# Altium footprint library 6-Connectors-3.PcbLib: 153 footprints (part 9 of 11)
Each footprint in its own frame and in the unit in brackets; x right, y up, seen from the top. Pads: shape width x height; smd on the part's side, far side on the other; paste and mask are expansions set on the pad; w line width, h text height; cw(c..) or ccw(c..) is an arc to the next point about the centre after c.
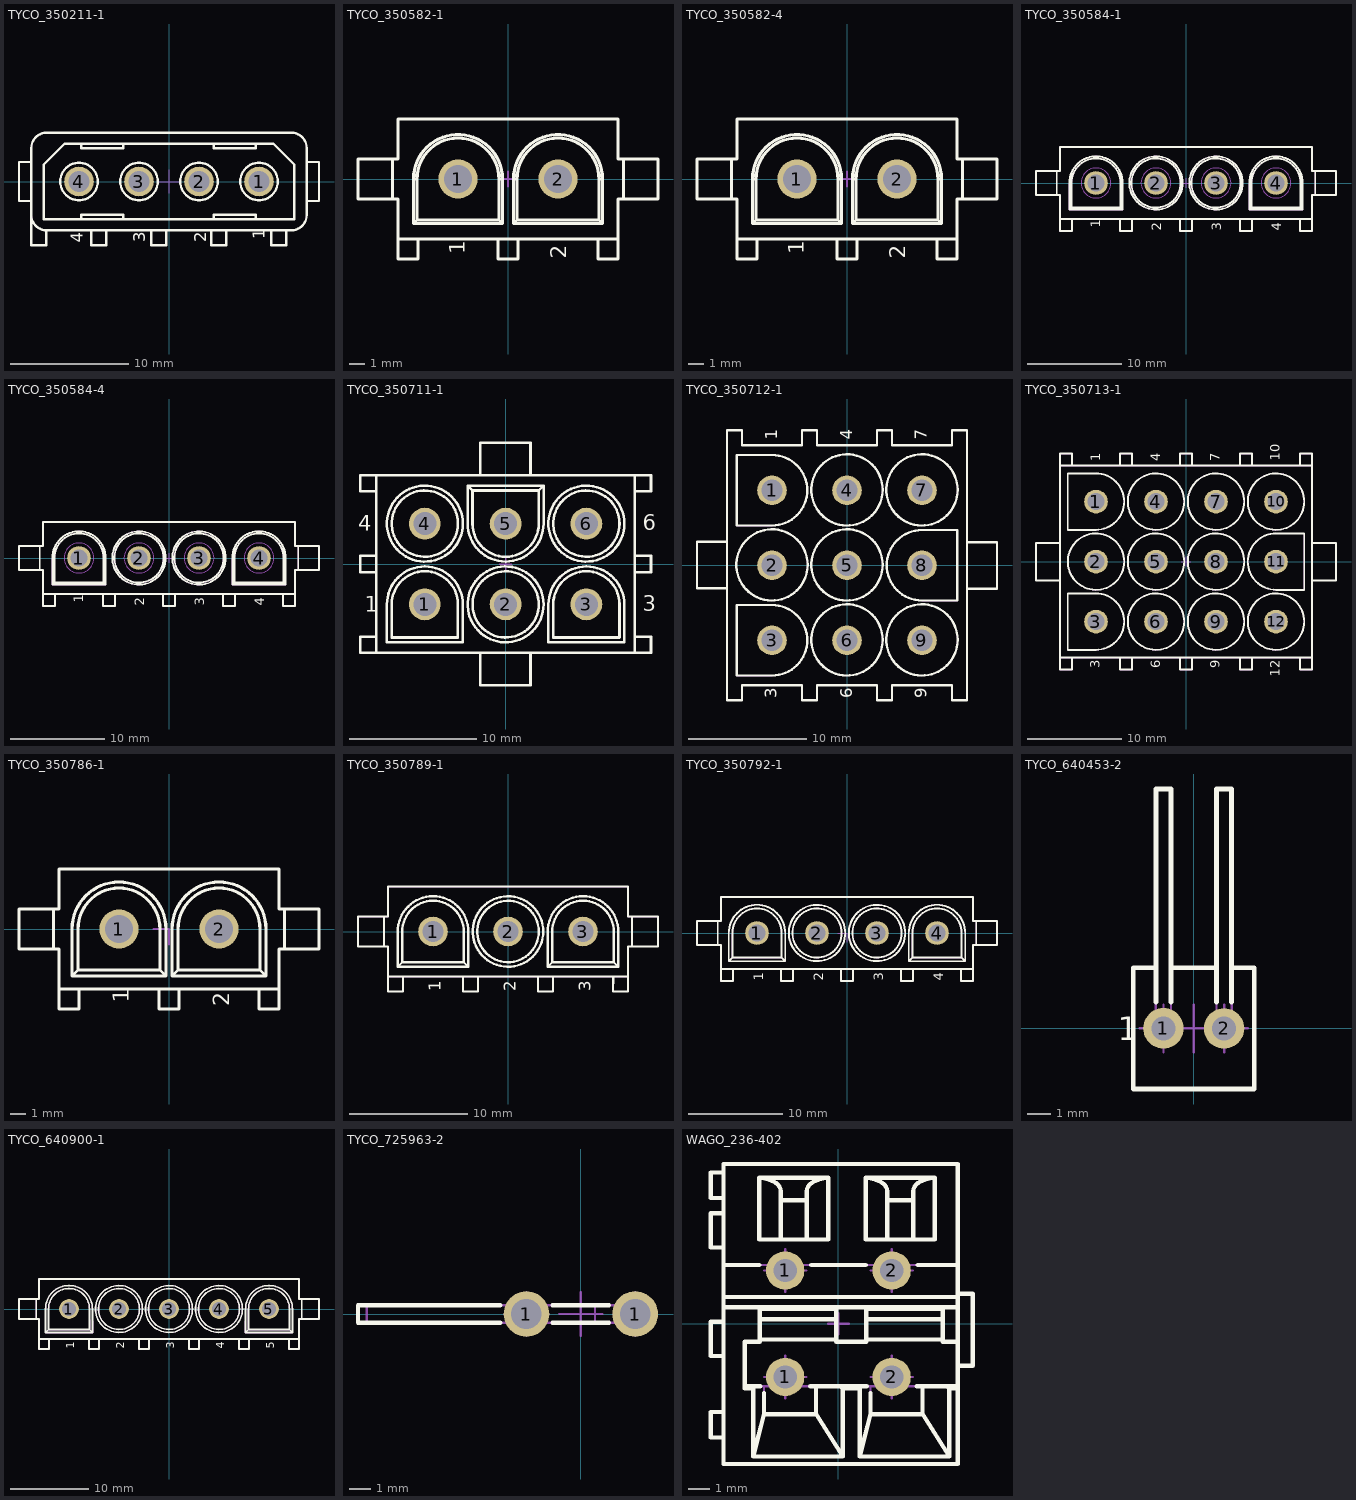
[diagram p8: the footprints below, top view; thin cyan lines are the x and y axes]

## TYCO_350211-1 [mm] "4 Circuits In-Line - 200\" Centerline, Commercial MATE-N-LOK Header"
height 10.29
pads (4):
  round 2.5 hole 1.8: 1(7.62,0) 2(2.54,0) 3(-2.54,0) 4(-7.62,0)
Top Overlay:
  circle w0.2: c-7.62,0 r1.587
  circle w0.2: c-2.54,0 r1.587
  circle w0.2: c2.54,0 r1.587
  circle w0.2: c7.62,0 r1.587
  lines w0.2: -11.652,-2.858 ccw(c-10.382,-2.858) -10.382,-4.128 ; -11.652,-1.651 -12.7,-1.651 -12.7,1.651 -11.652,1.651 ; -7.43,-3.207 -7.43,-2.826 -3.874,-2.826 -3.874,-3.207 ; -7.43,3.207 -7.43,2.826 -3.874,2.826 -3.874,3.207 ; -6.572,-4.128 -6.572,-5.398 -5.302,-5.398 -5.302,-4.128 ; -1.492,-4.128 -1.492,-5.398 -0.222,-5.398 -0.222,-4.128 ; 3.588,-4.128 3.588,-5.398 4.858,-5.398 4.858,-4.128 ; 3.797,-3.207 3.797,-2.826 7.353,-2.826 7.353,-3.207 ; 3.797,3.207 3.797,2.826 7.353,2.826 7.353,3.207 ; 7.537,-3.175 7.734,-3.175 ; 8.668,-4.128 8.668,-5.398 9.938,-5.398 9.938,-4.128 ; 11.652,-1.651 12.7,-1.651 12.7,1.651 11.652,1.651 ; -10.382,-4.128 -10.382,-5.398 -11.652,-5.398 -11.652,2.858 cw(c-10.382,2.858) -10.382,4.128 10.382,4.128 cw(c10.382,2.858) 11.652,2.858 11.652,-2.858 cw(c10.382,-2.858) 10.382,-4.128 -10.382,-4.128 ; -10.605,-3.207 -10.605,1.429 -8.827,3.207 8.827,3.207 10.605,1.429 10.605,-3.207 -10.605,-3.207
  text "1" at 8.1,-4.9 h1.02
  text "2" at 3.175,-5.15 h1.02
  text "3" at -2.015,-5.155 h1.02
  text "4" at -7.315,-5.205 h1.02
Mechanical 8:
  lines w0.1: -8.62,0 -7.62,0 ; -7.62,-1 -7.62,0 ; -7.62,1 -7.62,0 ; -6.62,0 -7.62,0 ; -3.54,0 -2.54,0 ; -2.54,-1 -2.54,0 ; -2.54,1 -2.54,0 ; -1.54,0 -2.54,0 ; -1,0 0,0 ; 0,-1 0,0 ; 0,1 0,0 ; 1,0 0,0 ; 1.54,0 2.54,0 ; 2.54,-1 2.54,0 ; 2.54,1 2.54,0 ; 3.54,0 2.54,0 ; 6.62,0 7.62,0 ; 7.62,-1 7.62,0 ; 7.62,1 7.62,0 ; 8.62,0 7.62,0
Mechanical 14:
  circle w0.1: c-7.62,0 r1.048
  circle w0.1: c-7.62,0 r1.587
  circle w0.1: c-2.54,0 r1.048
  circle w0.1: c-2.54,0 r1.587
  circle w0.1: c2.54,0 r1.048
  circle w0.1: c2.54,0 r1.587
  circle w0.1: c7.62,0 r1.048
  circle w0.1: c7.62,0 r1.587
  lines w0.1: -11.652,-2.858 ccw(c-10.382,-2.858) -10.382,-4.128 ; -11.652,-1.651 -12.7,-1.651 -12.7,1.651 -11.652,1.651 ; -7.43,-3.207 -7.43,-2.826 -3.874,-2.826 -3.874,-3.207 ; -7.43,3.207 -7.43,2.826 -3.874,2.826 -3.874,3.207 ; -6.572,-4.128 -6.572,-5.398 -5.302,-5.398 -5.302,-4.128 ; -1.492,-4.128 -1.492,-5.398 -0.222,-5.398 -0.222,-4.128 ; 3.588,-4.128 3.588,-5.398 4.858,-5.398 4.858,-4.128 ; 3.797,-3.207 3.797,-2.826 7.353,-2.826 7.353,-3.207 ; 3.797,3.207 3.797,2.826 7.353,2.826 7.353,3.207 ; 7.537,-3.175 7.734,-3.175 ; 8.668,-4.128 8.668,-5.398 9.938,-5.398 9.938,-4.128 ; 11.652,-1.651 12.7,-1.651 12.7,1.651 11.652,1.651 ; -10.382,-4.128 -10.382,-5.398 -11.652,-5.398 -11.652,2.858 cw(c-10.382,2.858) -10.382,4.128 10.382,4.128 cw(c10.382,2.858) 11.652,2.858 11.652,-2.858 cw(c10.382,-2.858) 10.382,-4.128 -10.382,-4.128 ; -10.605,-3.207 -10.605,1.429 -8.827,3.207 8.827,3.207 10.605,1.429 10.605,-3.207 -10.605,-3.207
  text "1" at 8.1,-4.9 h1.02
  text "2" at 3.175,-5.15 h1.02
  text "3" at -2.015,-5.155 h1.02
  text "4" at -7.315,-5.205 h1.02
3D body "TYCO_350211-1.stp": height 10.29, standoff -3.43, extent -12.7,-5.397 12.7,4.128

## TYCO_350582-1 [mm] "2 Circuits In-Line - Universal MATE-N-LOK Connector"
height 14.73
pads (2):
  round 2.5 hole 1.8: 1(-3.175,0) 2(3.175,0)
Top Overlay:
  lines w0.2: -7.325,-1.27 -7.325,1.27 ; -6.985,-3.81 6.985,-3.81 ; -5.715,-3.81 -5.715,-5.08 -6.985,-5.08 -6.985,-1.27 -9.525,-1.27 -9.525,1.27 -6.985,1.27 -6.985,3.81 6.985,3.81 6.985,1.27 9.525,1.27 9.525,-1.27 6.985,-1.27 6.985,-5.08 5.715,-5.08 5.715,-3.81 ; -0.635,-3.81 -0.635,-5.08 0.635,-5.08 0.635,-3.81 ; 7.325,-1.27 7.325,1.27 ; -5.998,-2.823 -0.352,-2.823 ; -5.998,-2.823 -5.779,-2.604 ; -5.998,-2.823 -5.998,0 ; -5.998,0 cw(c-3.175,0) -0.352,0 ; -5.998,0 -5.779,0 ; -5.779,-2.604 -0.572,-2.604 ; -5.779,-2.604 -5.779,0 ; -5.779,0 cw(c-3.175,0) -0.572,0 ; -0.572,-2.604 -0.572,0 ; -0.572,-2.604 -0.352,-2.823 ; -0.572,0 -0.352,0 ; -0.352,-2.823 -0.352,0 ; 0.352,-2.823 0.572,-2.604 ; 0.352,-2.823 0.352,0 ; 0.352,-2.823 5.998,-2.823 ; 0.352,0 cw(c3.175,0) 5.998,0 ; 0.352,0 0.572,0 ; 0.572,-2.604 0.572,0 ; 0.572,-2.604 5.779,-2.604 ; 0.572,0 cw(c3.175,0) 5.779,0 ; 5.779,-2.604 5.779,0 ; 5.779,-2.604 5.998,-2.823 ; 5.779,0 5.998,0 ; 5.998,-2.823 5.998,0
  text "2" at 3.712,-5.06 h1
  text "1" at -2.746,-4.783 h1
Mechanical 8:
  lines w0.1: -3.675,0 -3.175,0 ; -3.175,-0.5 -3.175,0 ; -3.175,0.5 -3.175,0 ; -2.675,0 -3.175,0 ; -0.5,0 0,0 ; 0,-0.5 0,0 ; 0,0.5 0,0 ; 0.5,0 0,0 ; 2.675,0 3.175,0 ; 3.175,-0.5 3.175,0 ; 3.175,0.5 3.175,0 ; 3.675,0 3.175,0
Mechanical 14:
  circle w0.1: c-3.175,0 r0.965
  circle w0.1: c3.175,0 r0.965
  lines w0.1: -7.325,-1.27 -7.325,1.27 ; -6.985,-3.81 6.985,-3.81 ; -5.715,-3.81 -5.715,-5.08 -6.985,-5.08 -6.985,-1.27 -9.525,-1.27 -9.525,1.27 -6.985,1.27 -6.985,3.81 6.985,3.81 6.985,1.27 9.525,1.27 9.525,-1.27 6.985,-1.27 6.985,-5.08 5.715,-5.08 5.715,-3.81 ; -4.12,-0.222 -2.23,-0.222 ; -4.12,0.222 -2.23,0.222 ; -0.635,-3.81 -0.635,-5.08 0.635,-5.08 0.635,-3.81 ; 2.23,-0.222 4.12,-0.222 ; 2.23,0.222 4.12,0.222 ; 7.325,-1.27 7.325,1.27 ; -5.998,-2.823 -0.352,-2.823 ; -5.998,-2.823 -5.779,-2.604 ; -5.998,-2.823 -5.998,0 ; -5.998,0 cw(c-3.175,0) -0.352,0 ; -5.998,0 -5.779,0 ; -5.779,-2.604 -0.572,-2.604 ; -5.779,-2.604 -5.779,0 ; -5.779,0 cw(c-3.175,0) -0.572,0 ; -0.572,-2.604 -0.572,0 ; -0.572,-2.604 -0.352,-2.823 ; -0.572,0 -0.352,0 ; -0.352,-2.823 -0.352,0 ; 0.352,-2.823 0.572,-2.604 ; 0.352,-2.823 0.352,0 ; 0.352,-2.823 5.998,-2.823 ; 0.352,0 cw(c3.175,0) 5.998,0 ; 0.352,0 0.572,0 ; 0.572,-2.604 0.572,0 ; 0.572,-2.604 5.779,-2.604 ; 0.572,0 cw(c3.175,0) 5.779,0 ; 5.779,-2.604 5.779,0 ; 5.779,-2.604 5.998,-2.823 ; 5.779,0 5.998,0 ; 5.998,-2.823 5.998,0
  text "2" at 3.712,-5.06 h1
  text "1" at -2.746,-4.783 h1
3D body "TYCO_350582-1.stp": height 14.82, standoff -5.33, extent -9.525,-5.08 9.525,3.81

## TYCO_350582-4 [mm] "2 Circuits In-Line - Universal MATE-N-LOK Connector"
height 14.73
pads (2):
  round 2.5 hole 1.8: 1(-3.175,0) 2(3.175,0)
Top Overlay:
  lines w0.2: -7.325,-1.27 -7.325,1.27 ; -6.985,-3.81 6.985,-3.81 ; -5.715,-3.81 -5.715,-5.08 -6.985,-5.08 -6.985,-1.27 -9.525,-1.27 -9.525,1.27 -6.985,1.27 -6.985,3.81 6.985,3.81 6.985,1.27 9.525,1.27 9.525,-1.27 6.985,-1.27 6.985,-5.08 5.715,-5.08 5.715,-3.81 ; -0.635,-3.81 -0.635,-5.08 0.635,-5.08 0.635,-3.81 ; 7.325,-1.27 7.325,1.27 ; -5.998,-2.823 -0.352,-2.823 ; -5.998,-2.823 -5.779,-2.604 ; -5.998,-2.823 -5.998,0 ; -5.998,0 cw(c-3.175,0) -0.352,0 ; -5.998,0 -5.779,0 ; -5.779,-2.604 -0.572,-2.604 ; -5.779,-2.604 -5.779,0 ; -5.779,0 cw(c-3.175,0) -0.572,0 ; -0.572,-2.604 -0.572,0 ; -0.572,-2.604 -0.352,-2.823 ; -0.572,0 -0.352,0 ; -0.352,-2.823 -0.352,0 ; 0.352,-2.823 0.572,-2.604 ; 0.352,-2.823 0.352,0 ; 0.352,-2.823 5.998,-2.823 ; 0.352,0 cw(c3.175,0) 5.998,0 ; 0.352,0 0.572,0 ; 0.572,-2.604 0.572,0 ; 0.572,-2.604 5.779,-2.604 ; 0.572,0 cw(c3.175,0) 5.779,0 ; 5.779,-2.604 5.779,0 ; 5.779,-2.604 5.998,-2.823 ; 5.779,0 5.998,0 ; 5.998,-2.823 5.998,0
  text "2" at 3.712,-5.06 h1
  text "1" at -2.746,-4.783 h1
Mechanical 8:
  lines w0.1: -3.675,0 -3.175,0 ; -3.175,-0.5 -3.175,0 ; -3.175,0.5 -3.175,0 ; -2.675,0 -3.175,0 ; -0.5,0 0,0 ; 0,-0.5 0,0 ; 0,0.5 0,0 ; 0.5,0 0,0 ; 2.675,0 3.175,0 ; 3.175,-0.5 3.175,0 ; 3.175,0.5 3.175,0 ; 3.675,0 3.175,0
Mechanical 14:
  circle w0.1: c-3.175,0 r0.965
  circle w0.1: c3.175,0 r0.965
  lines w0.1: -7.325,-1.27 -7.325,1.27 ; -6.985,-3.81 6.985,-3.81 ; -5.715,-3.81 -5.715,-5.08 -6.985,-5.08 -6.985,-1.27 -9.525,-1.27 -9.525,1.27 -6.985,1.27 -6.985,3.81 6.985,3.81 6.985,1.27 9.525,1.27 9.525,-1.27 6.985,-1.27 6.985,-5.08 5.715,-5.08 5.715,-3.81 ; -4.12,-0.222 -2.23,-0.222 ; -4.12,0.222 -2.23,0.222 ; -0.635,-3.81 -0.635,-5.08 0.635,-5.08 0.635,-3.81 ; 2.23,-0.222 4.12,-0.222 ; 2.23,0.222 4.12,0.222 ; 7.325,-1.27 7.325,1.27 ; -5.998,-2.823 -0.352,-2.823 ; -5.998,-2.823 -5.779,-2.604 ; -5.998,-2.823 -5.998,0 ; -5.998,0 cw(c-3.175,0) -0.352,0 ; -5.998,0 -5.779,0 ; -5.779,-2.604 -0.572,-2.604 ; -5.779,-2.604 -5.779,0 ; -5.779,0 cw(c-3.175,0) -0.572,0 ; -0.572,-2.604 -0.572,0 ; -0.572,-2.604 -0.352,-2.823 ; -0.572,0 -0.352,0 ; -0.352,-2.823 -0.352,0 ; 0.352,-2.823 0.572,-2.604 ; 0.352,-2.823 0.352,0 ; 0.352,-2.823 5.998,-2.823 ; 0.352,0 cw(c3.175,0) 5.998,0 ; 0.352,0 0.572,0 ; 0.572,-2.604 0.572,0 ; 0.572,-2.604 5.779,-2.604 ; 0.572,0 cw(c3.175,0) 5.779,0 ; 5.779,-2.604 5.779,0 ; 5.779,-2.604 5.998,-2.823 ; 5.779,0 5.998,0 ; 5.998,-2.823 5.998,0
  text "2" at 3.712,-5.06 h1
  text "1" at -2.746,-4.783 h1
3D body "TYCO_350582-4.stp": height 14.82, standoff -5.33, extent -9.525,-5.08 9.525,3.81

## TYCO_350584-1 [mm] "4 Circuits In-Line - Universal MATE-N-LOK Connector"
height 14.73
pads (4):
  round 2.5 hole 1.8: 1(-9.525,0) 2(-3.175,0) 3(3.175,0) 4(9.525,0)
Top Overlay:
  circle w0.2: c3.175,0 r2.823
  circle w0.2: c-3.175,0 r2.823
  circle w0.2: c3.175,0 r2.604
  circle w0.2: c-3.175,0 r2.604
  lines w0.2: -13.675,-1.27 -13.675,1.27 ; -13.335,-3.81 13.335,-3.81 ; -12.065,-3.81 -12.065,-5.08 -13.335,-5.08 -13.335,-1.27 -15.875,-1.27 -15.875,1.27 -13.335,1.27 -13.335,3.81 13.335,3.81 13.335,1.27 15.875,1.27 15.875,-1.27 13.335,-1.27 13.335,-5.08 12.065,-5.08 12.065,-3.81 ; -6.985,-3.81 -6.985,-5.08 -5.715,-5.08 -5.715,-3.81 ; -0.635,-3.81 -0.635,-5.08 0.635,-5.08 0.635,-3.81 ; 5.715,-3.81 5.715,-5.08 6.985,-5.08 6.985,-3.81 ; 13.675,-1.27 13.675,1.27 ; -12.348,-2.823 -6.702,-2.823 ; -12.348,-2.823 -12.129,-2.604 ; -12.348,-2.823 -12.348,0 ; -12.348,0 cw(c-9.525,0) -6.702,0 ; -12.348,0 -12.129,0 ; -12.129,-2.604 -6.922,-2.604 ; -12.129,-2.604 -12.129,0 ; -12.129,0 cw(c-9.525,0) -6.922,0 ; -6.922,-2.604 -6.702,-2.823 ; -6.922,-2.604 -6.922,0 ; -6.922,0 -6.702,0 ; -6.702,-2.823 -6.702,0 ; 6.702,-2.823 6.922,-2.604 ; 6.702,-2.823 6.702,0 ; 6.702,-2.823 12.348,-2.823 ; 6.702,0 cw(c9.525,0) 12.348,0 ; 6.702,0 6.922,0 ; 6.922,-2.604 6.922,0 ; 6.922,-2.604 12.129,-2.604 ; 6.922,0 cw(c9.525,0) 12.129,0 ; 12.129,-2.604 12.129,0 ; 12.129,-2.604 12.348,-2.823 ; 12.129,0 12.348,0 ; 12.348,-2.823 12.348,0
  text "4" at 10.062,-5.035 h1
  text "3" at 3.712,-5.035 h1
  text "2" at -2.638,-5.035 h1
  text "1" at -9.096,-4.733 h1
Mechanical 8:
  lines w0.1: -10.025,0 -9.525,0 ; -9.525,-0.5 -9.525,0 ; -9.525,0.5 -9.525,0 ; -9.025,0 -9.525,0 ; -3.675,0 -3.175,0 ; -3.175,-0.5 -3.175,0 ; -3.175,0.5 -3.175,0 ; -2.675,0 -3.175,0 ; -0.5,0 0,0 ; 0,-0.5 0,0 ; 0,0.5 0,0 ; 0.5,0 0,0 ; 2.675,0 3.175,0 ; 3.175,-0.5 3.175,0 ; 3.175,0.5 3.175,0 ; 3.675,0 3.175,0 ; 9.025,0 9.525,0 ; 9.525,-0.5 9.525,0 ; 9.525,0.5 9.525,0 ; 10.025,0 9.525,0
Mechanical 14:
  circle w0.1: c-3.175,0 r0.965
  circle w0.1: c3.175,0 r0.965
  circle w0.1: c3.175,0 r2.823
  circle w0.1: c-3.175,0 r2.823
  circle w0.1: c3.175,0 r2.604
  circle w0.1: c-3.175,0 r2.604
  circle w0.1: c-9.525,0 r1.587
  circle w0.1: c9.525,0 r1.587
  circle w0.1: c3.175,0 r1.587
  circle w0.1: c-3.175,0 r1.587
  circle w0.1: c-9.525,0 r1.099
  circle w0.1: c-3.175,0 r1.099
  circle w0.1: c3.175,0 r1.099
  circle w0.1: c9.525,0 r1.099
  lines w0.1: -13.675,-1.27 -13.675,1.27 ; -13.335,-3.81 13.335,-3.81 ; -12.065,-3.81 -12.065,-5.08 -13.335,-5.08 -13.335,-1.27 -15.875,-1.27 -15.875,1.27 -13.335,1.27 -13.335,3.81 13.335,3.81 13.335,1.27 15.875,1.27 15.875,-1.27 13.335,-1.27 13.335,-5.08 12.065,-5.08 12.065,-3.81 ; -10.601,-0.222 -8.449,-0.222 ; -10.601,0.222 -8.449,0.222 ; -10.065,-0.222 ccw(c-9.525,0) -8.985,-0.222 ; -10.065,0.222 cw(c-9.525,0) -8.985,0.222 ; -6.985,-3.81 -6.985,-5.08 -5.715,-5.08 -5.715,-3.81 ; -4.251,-0.222 -2.099,-0.222 ; -4.251,0.222 -2.099,0.222 ; -3.715,-0.222 ccw(c-3.175,0) -2.635,-0.222 ; -3.715,0.222 cw(c-3.175,0) -2.635,0.222 ; -0.635,-3.81 -0.635,-5.08 0.635,-5.08 0.635,-3.81 ; 2.099,-0.222 4.251,-0.222 ; 2.099,0.222 4.251,0.222 ; 2.635,-0.222 ccw(c3.175,0) 3.715,-0.222 ; 2.635,0.222 cw(c3.175,0) 3.715,0.222 ; 5.715,-3.81 5.715,-5.08 6.985,-5.08 6.985,-3.81 ; 8.449,-0.222 10.601,-0.222 ; 8.449,0.222 10.601,0.222 ; 8.985,-0.222 ccw(c9.525,0) 10.065,-0.222 ; 8.985,0.222 cw(c9.525,0) 10.065,0.222 ; 13.675,-1.27 13.675,1.27 ; -12.348,-2.823 -6.702,-2.823 ; -12.348,-2.823 -12.129,-2.604 ; -12.348,-2.823 -12.348,0 ; -12.348,0 cw(c-9.525,0) -6.702,0 ; -12.348,0 -12.129,0 ; -12.129,-2.604 -6.922,-2.604 ; -12.129,-2.604 -12.129,0 ; -12.129,0 cw(c-9.525,0) -6.922,0 ; -6.922,-2.604 -6.702,-2.823 ; -6.922,-2.604 -6.922,0 ; -6.922,0 -6.702,0 ; -6.702,-2.823 -6.702,0 ; 6.702,-2.823 6.922,-2.604 ; 6.702,-2.823 6.702,0 ; 6.702,-2.823 12.348,-2.823 ; 6.702,0 cw(c9.525,0) 12.348,0 ; 6.702,0 6.922,0 ; 6.922,-2.604 6.922,0 ; 6.922,-2.604 12.129,-2.604 ; 6.922,0 cw(c9.525,0) 12.129,0 ; 12.129,-2.604 12.129,0 ; 12.129,-2.604 12.348,-2.823 ; 12.129,0 12.348,0 ; 12.348,-2.823 12.348,0
  text "4" at 10.062,-5.035 h1
  text "3" at 3.712,-5.035 h1
  text "2" at -2.638,-5.035 h1
  text "1" at -9.096,-4.733 h1
3D body "TYCO_350584-1.stp": height 14.82, standoff -5.08, extent -15.875,-5.08 15.875,3.81

## TYCO_350584-4 [mm] "4 Circuits In-Line - Universal MATE-N-LOK Connector"
height 14.73
pads (4):
  round 2.5 hole 1.8: 1(-9.525,0) 2(-3.175,0) 3(3.175,0) 4(9.525,0)
Top Overlay:
  circle w0.2: c-3.175,0 r2.604
  circle w0.2: c3.175,0 r2.604
  circle w0.2: c-3.175,0 r2.823
  circle w0.2: c3.175,0 r2.823
  lines w0.2: -13.675,-1.27 -13.675,1.27 ; -13.335,-3.81 13.335,-3.81 ; -12.065,-3.81 -12.065,-5.08 -13.335,-5.08 -13.335,-1.27 -15.875,-1.27 -15.875,1.27 -13.335,1.27 -13.335,3.81 13.335,3.81 13.335,1.27 15.875,1.27 15.875,-1.27 13.335,-1.27 13.335,-5.08 12.065,-5.08 12.065,-3.81 ; -6.985,-3.81 -6.985,-5.08 -5.715,-5.08 -5.715,-3.81 ; -0.635,-3.81 -0.635,-5.08 0.635,-5.08 0.635,-3.81 ; 5.715,-3.81 5.715,-5.08 6.985,-5.08 6.985,-3.81 ; 13.675,-1.27 13.675,1.27 ; -12.348,-2.823 -12.348,0 ; -12.348,-2.823 -12.129,-2.604 ; -12.348,-2.823 -6.702,-2.823 ; -12.348,0 cw(c-9.525,0) -6.702,0 ; -12.348,0 -12.129,0 ; -12.129,-2.604 -12.129,0 ; -12.129,-2.604 -6.922,-2.604 ; -12.129,0 cw(c-9.525,0) -6.922,0 ; -6.922,-2.604 -6.922,0 ; -6.922,-2.604 -6.702,-2.823 ; -6.922,0 -6.702,0 ; -6.702,-2.823 -6.702,0 ; 6.702,-2.823 12.348,-2.823 ; 6.702,-2.823 6.702,0 ; 6.702,-2.823 6.922,-2.604 ; 6.702,0 cw(c9.525,0) 12.348,0 ; 6.702,0 6.922,0 ; 6.922,-2.604 12.129,-2.604 ; 6.922,-2.604 6.922,0 ; 6.922,0 cw(c9.525,0) 12.129,0 ; 12.129,-2.604 12.348,-2.823 ; 12.129,-2.604 12.129,0 ; 12.129,0 12.348,0 ; 12.348,-2.823 12.348,0
  text "1" at -9.096,-4.733 h1
  text "2" at -2.638,-5.035 h1
  text "3" at 3.712,-5.035 h1
  text "4" at 10.062,-5.035 h1
Mechanical 8:
  lines w0.1: -10.025,0 -9.525,0 ; -9.525,-0.5 -9.525,0 ; -9.525,0.5 -9.525,0 ; -9.025,0 -9.525,0 ; -3.675,0 -3.175,0 ; -3.175,-0.5 -3.175,0 ; -3.175,0.5 -3.175,0 ; -2.675,0 -3.175,0 ; -0.5,0 0,0 ; 0,-0.5 0,0 ; 0,0.5 0,0 ; 0.5,0 0,0 ; 2.675,0 3.175,0 ; 3.175,-0.5 3.175,0 ; 3.175,0.5 3.175,0 ; 3.675,0 3.175,0 ; 9.025,0 9.525,0 ; 9.525,-0.5 9.525,0 ; 9.525,0.5 9.525,0 ; 10.025,0 9.525,0
Mechanical 14:
  circle w0.1: c9.525,0 r1.099
  circle w0.1: c3.175,0 r1.099
  circle w0.1: c-3.175,0 r1.099
  circle w0.1: c-9.525,0 r1.099
  circle w0.1: c-3.175,0 r1.587
  circle w0.1: c3.175,0 r1.587
  circle w0.1: c9.525,0 r1.587
  circle w0.1: c-9.525,0 r1.587
  circle w0.1: c-3.175,0 r2.604
  circle w0.1: c3.175,0 r2.604
  circle w0.1: c-3.175,0 r2.823
  circle w0.1: c3.175,0 r2.823
  circle w0.1: c3.175,0 r0.965
  circle w0.1: c-3.175,0 r0.965
  lines w0.1: -13.675,-1.27 -13.675,1.27 ; -13.335,-3.81 13.335,-3.81 ; -12.065,-3.81 -12.065,-5.08 -13.335,-5.08 -13.335,-1.27 -15.875,-1.27 -15.875,1.27 -13.335,1.27 -13.335,3.81 13.335,3.81 13.335,1.27 15.875,1.27 15.875,-1.27 13.335,-1.27 13.335,-5.08 12.065,-5.08 12.065,-3.81 ; -10.601,-0.222 -8.449,-0.222 ; -10.601,0.222 -8.449,0.222 ; -10.065,-0.222 ccw(c-9.525,0) -8.985,-0.222 ; -10.065,0.222 cw(c-9.525,0) -8.985,0.222 ; -6.985,-3.81 -6.985,-5.08 -5.715,-5.08 -5.715,-3.81 ; -4.251,-0.222 -2.099,-0.222 ; -4.251,0.222 -2.099,0.222 ; -3.715,-0.222 ccw(c-3.175,0) -2.635,-0.222 ; -3.715,0.222 cw(c-3.175,0) -2.635,0.222 ; -0.635,-3.81 -0.635,-5.08 0.635,-5.08 0.635,-3.81 ; 2.099,-0.222 4.251,-0.222 ; 2.099,0.222 4.251,0.222 ; 2.635,-0.222 ccw(c3.175,0) 3.715,-0.222 ; 2.635,0.222 cw(c3.175,0) 3.715,0.222 ; 5.715,-3.81 5.715,-5.08 6.985,-5.08 6.985,-3.81 ; 8.449,-0.222 10.601,-0.222 ; 8.449,0.222 10.601,0.222 ; 8.985,-0.222 ccw(c9.525,0) 10.065,-0.222 ; 8.985,0.222 cw(c9.525,0) 10.065,0.222 ; 13.675,-1.27 13.675,1.27 ; -12.348,-2.823 -12.348,0 ; -12.348,-2.823 -12.129,-2.604 ; -12.348,-2.823 -6.702,-2.823 ; -12.348,0 cw(c-9.525,0) -6.702,0 ; -12.348,0 -12.129,0 ; -12.129,-2.604 -12.129,0 ; -12.129,-2.604 -6.922,-2.604 ; -12.129,0 cw(c-9.525,0) -6.922,0 ; -6.922,-2.604 -6.922,0 ; -6.922,-2.604 -6.702,-2.823 ; -6.922,0 -6.702,0 ; -6.702,-2.823 -6.702,0 ; 6.702,-2.823 12.348,-2.823 ; 6.702,-2.823 6.702,0 ; 6.702,-2.823 6.922,-2.604 ; 6.702,0 cw(c9.525,0) 12.348,0 ; 6.702,0 6.922,0 ; 6.922,-2.604 12.129,-2.604 ; 6.922,-2.604 6.922,0 ; 6.922,0 cw(c9.525,0) 12.129,0 ; 12.129,-2.604 12.348,-2.823 ; 12.129,-2.604 12.129,0 ; 12.129,0 12.348,0 ; 12.348,-2.823 12.348,0
  text "1" at -9.096,-4.733 h1
  text "2" at -2.638,-5.035 h1
  text "3" at 3.712,-5.035 h1
  text "4" at 10.062,-5.035 h1
3D body "TYCO_350584-4.stp": height 14.82, standoff -5.08, extent -15.875,-5.08 15.875,3.81

## TYCO_350711-1 [mm] "6 Circuits Mini-Universal MATE-N-LOK Connector"
height 14.73
pads (6):
  round 2.5 hole 1.8: 1(-6.35,-3.175) 2(0,-3.175) 3(6.35,-3.175) 4(-6.35,3.175) 5(0,3.175) 6(6.35,3.175)
Top Overlay:
  circle w0.2: c-6.35,3.175 r2.984
  circle w0.2: c-6.35,3.175 r2.604
  circle w0.2: c6.35,3.175 r2.984
  circle w0.2: c6.35,3.175 r2.604
  circle w0.2: c0,-3.175 r2.984
  circle w0.2: c0,-3.175 r2.604
  lines w0.2: -10.16,-6.985 -10.16,6.985 ; -10.16,-5.715 -11.43,-5.715 -11.43,-6.985 11.43,-6.985 11.43,-5.715 10.16,-5.715 ; -10.16,-0.635 -11.43,-0.635 -11.43,0.635 -10.16,0.635 ; -10.16,5.715 -11.43,5.715 -11.43,6.985 11.43,6.985 11.43,5.715 10.16,5.715 ; -1.981,-6.985 -1.981,-9.525 1.956,-9.525 1.956,-6.985 ; -1.981,6.985 -1.981,9.525 1.956,9.525 1.956,6.985 ; 10.16,-6.985 10.16,6.985 ; 10.16,-0.635 11.43,-0.635 11.43,0.635 10.16,0.635 ; -2.984,6.16 -2.984,3.175 ccw(c0,3.175) 2.984,3.175 2.985,6.16 ; -2.984,6.16 2.985,6.16 ; -2.985,6.16 -2.604,5.779 ; -2.604,5.779 2.604,5.779 ; -2.604,5.779 -2.604,3.175 ccw(c0,3.175) 2.604,3.175 2.604,5.779 ; 2.604,5.779 2.985,6.16 ; -9.334,-6.16 -9.334,-3.175 cw(c-6.35,-3.175) -3.366,-3.175 -3.366,-6.16 -9.334,-6.16 ; -8.954,-5.779 -8.954,-3.175 cw(c-6.35,-3.175) -3.747,-3.175 -3.747,-5.779 -8.954,-5.779 ; 3.366,-6.16 3.366,-3.175 cw(c6.35,-3.175) 9.334,-3.175 9.335,-6.16 3.366,-6.16 ; 3.747,-5.779 3.747,-3.175 cw(c6.35,-3.175) 8.954,-3.175 8.954,-5.779 3.747,-5.779
  text "1" at -11.055,-3.765 h1.2
  text "4" at -11.605,2.61 h1.2
  text "6" at 10.78,2.64 h1.2
  text "3" at 10.78,-3.71 h1.2
Mechanical 8:
  lines w0.1: -6.85,-3.175 -6.35,-3.175 ; -6.85,3.175 -6.35,3.175 ; -6.35,-3.675 -6.35,-3.175 ; -6.35,-2.675 -6.35,-3.175 ; -6.35,2.675 -6.35,3.175 ; -6.35,3.675 -6.35,3.175 ; -5.85,-3.175 -6.35,-3.175 ; -5.85,3.175 -6.35,3.175 ; -0.5,-3.175 0,-3.175 ; -0.5,0 0,0 ; -0.5,3.175 0,3.175 ; 0,-3.675 0,-3.175 ; 0,-2.675 0,-3.175 ; 0,-0.5 0,0 ; 0,0.5 0,0 ; 0,2.675 0,3.175 ; 0,3.675 0,3.175 ; 0.5,-3.175 0,-3.175 ; 0.5,0 0,0 ; 0.5,3.175 0,3.175 ; 5.85,-3.175 6.35,-3.175 ; 5.85,3.175 6.35,3.175 ; 6.35,-3.675 6.35,-3.175 ; 6.35,-2.675 6.35,-3.175 ; 6.35,2.675 6.35,3.175 ; 6.35,3.675 6.35,3.175 ; 6.85,-3.175 6.35,-3.175 ; 6.85,3.175 6.35,3.175
Mechanical 14:
  circle w0.1: c-6.35,3.175 r2.984
  circle w0.1: c-6.35,3.175 r2.604
  circle w0.1: c6.35,3.175 r2.984
  circle w0.1: c6.35,3.175 r2.604
  circle w0.1: c0,-3.175 r2.984
  circle w0.1: c0,-3.175 r2.604
  lines w0.1: -10.16,-6.985 -10.16,6.985 ; -10.16,-5.715 -11.43,-5.715 -11.43,-6.985 11.43,-6.985 11.43,-5.715 10.16,-5.715 ; -10.16,-0.635 -11.43,-0.635 -11.43,0.635 -10.16,0.635 ; -10.16,5.715 -11.43,5.715 -11.43,6.985 11.43,6.985 11.43,5.715 10.16,5.715 ; -1.981,-6.985 -1.981,-9.525 1.956,-9.525 1.956,-6.985 ; -1.981,6.985 -1.981,9.525 1.956,9.525 1.956,6.985 ; 10.16,-6.985 10.16,6.985 ; 10.16,-0.635 11.43,-0.635 11.43,0.635 10.16,0.635 ; -2.984,6.16 -2.984,3.175 ccw(c0,3.175) 2.984,3.175 2.985,6.16 ; -2.984,6.16 2.985,6.16 ; -2.985,6.16 -2.604,5.779 ; -2.604,5.779 2.604,5.779 ; -2.604,5.779 -2.604,3.175 ccw(c0,3.175) 2.604,3.175 2.604,5.779 ; 2.604,5.779 2.985,6.16 ; -9.334,-6.16 -9.334,-3.175 cw(c-6.35,-3.175) -3.366,-3.175 -3.366,-6.16 -9.334,-6.16 ; -8.954,-5.779 -8.954,-3.175 cw(c-6.35,-3.175) -3.747,-3.175 -3.747,-5.779 -8.954,-5.779 ; 3.366,-6.16 3.366,-3.175 cw(c6.35,-3.175) 9.334,-3.175 9.335,-6.16 3.366,-6.16 ; 3.747,-5.779 3.747,-3.175 cw(c6.35,-3.175) 8.954,-3.175 8.954,-5.779 3.747,-5.779